# Altium schematic symbol library Minh_Lib.SchLib: 619 symbols (part 4 of 4) (continued)
## TAJD106K035RNJ (continued)
footprint Capacitor/Tantalum - SMD7343/D-AVX (D-7343/AVX)
pins: 1, 2
text: +

## TAJD106K050RNJ
designator C?  Supplier Part Number 1: 6993166
钽电容 10uF ±10% 50V 0.8Ω D型7343; Manufacturer: Kyocera AVX; Manufacturer Part Number: TAJD106K050RNJ; Dielectric Material: Tantalum; ESR (Equivalent Series Resistance): 800mR; Leakage Current: 5uA; Polarity: Polar; Dissipation Factor: 6%; Supplier 1: RSComponents; RoHS: Yes; Category: Tantalum Capacitors; Stock 1: 495; Pricing 1: 1=3.99400, 10=3.83300, 25=3.67200, 50=3.32200, 100=2.97200 (USD); Mount: Surface Mount,PCB; Case/Package: 2917; Number of Pins: 2; Case Code (Metric): 7343; Case Code (Imperial): 2917; Min Operating Temperature: -55°C; Max Operating Temperature: 125°C; Capacitance: 10uF; Tolerance: 10%; Voltage Rating (DC): 50V; Voltage Rating: 50V; Package Quantity: 1; Packaging: Tape and Reel; Termination: SMD/SMT; Voltage: 50V; Features: General Purpose; Series: TAJ; Construction: Flat; Length: 7.3mm; Width: 0.169inch; Height: 2.9mm; Depth: 4.3mm; Height - Seated (Max): 0.122inch; Radiation Hardening: No; Lead Free: Lead Free; RoHS Compliant: Yes; REACH SVHC: No SVHC; ComponentLink1URL: https://datasheet.ciiva.com/11793/0900766b80df8b87-11793657.pdf?src-supplier=RSComponents; ComponentLink1Description: https://datasheet.ciiva.com/11793/0900766b80df8b87-11793657.pdf?src-supplier=RSComponents; ComponentLink2URL: https://datasheet.ciiva.com/7730/49917-7730763.pdf?src-supplier=Element14; ComponentLink2Description: https://datasheet.ciiva.com/7730/49917-7730763.pdf?src-supplier=Element14; ComponentLink3URL: https://datasheet.ciiva.com/7730/49917-7730761.pdf?src-supplier=Element14; ComponentLink3Description: https://datasheet.ciiva.com/7730/49917-7730761.pdf?src-supplier=Element14; ComponentLink4URL: https://datasheet.ciiva.com/5937/taj-5937102.pdf?src-supplier=Farnell; ComponentLink4Description: https://datasheet.ciiva.com/5937/taj-5937102.pdf?src-supplier=Farnell; ComponentLink5URL: https://datasheet.ciiva.com/7730/taj-7730985.pdf?src-supplier=Element14; ComponentLink5Description: https://datasheet.ciiva.com/7730/taj-7730985.pdf?src-supplier=Element14; ComponentLink6URL: https://datasheet.ciiva.com/7730/1826076-7730762.pdf?src-supplier=Element14; ComponentLink6Description: https://datasheet.ciiva.com/7730/1826076-7730762.pdf?src-supplier=Element14; ComponentLink7URL: https://datasheet.ciiva.com/265/taj-265284.pdf?src-supplier=Digi-Key; ComponentLink7Description: https://datasheet.ciiva.com/265/taj-265284.pdf?src-supplier=Digi-Key; ComponentLink8URL: https://datasheet.ciiva.com/265/taj-265283.pdf?src-supplier=Digi-Key; ComponentLink8Description: https://datasheet.ciiva.com/265/taj-265283.pdf?src-supplier=Digi-Key; ComponentLink9URL: https://datasheet.ciiva.com/265/taj-265285.pdf?src-supplier=Digi-Key; ComponentLink9Description: https://datasheet.ciiva.com/265/taj-265285.pdf?src-supplier=Digi-Key; ComponentLink10URL: https://datasheet.ciiva.com/12911/taj-27497-12911222.pdf?src-supplier=Mouser; ComponentLink10Description: https://datasheet.ciiva.com/12911/taj-27497-12911222.pdf?src-supplier=Mouser; ComponentLink11URL: https://datasheet.ciiva.com/14585/70001050-14585949.pdf?src-supplier=Allied+Electronics; ComponentLink11Description: https://datasheet.ciiva.com/14585/70001050-14585949.pdf?src-supplier=Allied+Electronics; ComponentLink12URL: https://datasheet.ciiva.com/14598/70001050-14598925.pdf?src-supplier=Allied+Electronics; ComponentLink12Description: https://datasheet.ciiva.com/14598/70001050-14598925.pdf?src-supplier=Allied+Electronics; ComponentLink13URL: https://datasheet.ciiva.com/11227/taj-11227069.pdf?src-supplier=Avnet; ComponentLink13Description: https://datasheet.ciiva.com/11227/taj-11227069.pdf?src-supplier=Avnet
footprint Capacitor/Tantalum - SMD7343/D-AVX (D-7343/AVX)
pins: 1, 2
text: +

## TAJD107K006RNJ
designator C?  Supplier Part Number 1: 1360315
Cap Tant Solid 100uF 6.3V D CASE 10% (7.3 X 4.3 X 2.9mm) SMD 7343-31 0.9 Ohm 125AHA T/R; Manufacturer: Kyocera AVX; Manufacturer Part Number: TAJD107K006RNJ; ESR (Equivalent Series Resistance): 900mR; Polarity: Polar; Dissipation Factor: 6%; Supplier 1: RSComponents; RoHS: Yes; Category: Tantalum Capacitors; Stock 1: 110; Pricing 1: 500=0.71500, 2500=0.58900, 5000=0.53000 (USD); Mount: Surface Mount; Case/Package: 2917; Number of Pins: 2; Case Code (Metric): 7343; Case Code (Imperial): 2917; Min Operating Temperature: -55°C; Max Operating Temperature: 125°C; Capacitance: 100uF; Tolerance: 10%; Packaging: Tape and Reel; Voltage Rating: 6.3V; Package Quantity: 1; Termination: SMD/SMT; Voltage Rating (DC): 6.3V; Features: General Purpose; Series: TAJ; Construction: Flat; Length: 7.3mm; Width: 0.169inch; Height: 3.1mm; Depth: 4.3mm; Height - Seated (Max): 0.122inch; Radiation Hardening: No; REACH SVHC: No SVHC; Lead Free: Lead Free; RoHS Compliant: Yes; ComponentLink1URL: https://datasheet.ciiva.com/264/taj-264533.pdf?src-supplier=Digi-Key; ComponentLink1Description: https://datasheet.ciiva.com/264/taj-264533.pdf?src-supplier=Digi-Key; ComponentLink2URL: https://datasheet.ciiva.com/22703/1719052-22703317.pdf?src-supplier=Element14; ComponentLink2Description: https://datasheet.ciiva.com/22703/1719052-22703317.pdf?src-supplier=Element14; ComponentLink3URL: https://datasheet.ciiva.com/264/taj-264534.pdf?src-supplier=Digi-Key; ComponentLink3Description: https://datasheet.ciiva.com/264/taj-264534.pdf?src-supplier=Digi-Key; ComponentLink4URL: https://datasheet.ciiva.com/264/taj-264532.pdf?src-supplier=Digi-Key; ComponentLink4Description: https://datasheet.ciiva.com/264/taj-264532.pdf?src-supplier=Digi-Key; ComponentLink5URL: https://datasheet.ciiva.com/8080/1719052-8080374.pdf?src-supplier=Element14; ComponentLink5Description: https://datasheet.ciiva.com/8080/1719052-8080374.pdf?src-supplier=Element14; ComponentLink6URL: https://datasheet.ciiva.com/28609/taj-28609416.pdf?src-supplier=Element14; ComponentLink6Description: https://datasheet.ciiva.com/28609/taj-28609416.pdf?src-supplier=Element14; ComponentLink7URL: https://datasheet.ciiva.com/7720/1680476-7720620.pdf?src-supplier=Element14; ComponentLink7Description: https://datasheet.ciiva.com/7720/1680476-7720620.pdf?src-supplier=Element14; ComponentLink8URL: https://datasheet.ciiva.com/12910/taj-27497-12910172.pdf?src-supplier=Mouser; ComponentLink8Description: https://datasheet.ciiva.com/12910/taj-27497-12910172.pdf?src-supplier=Mouser; ComponentLink9URL: https://datasheet.ciiva.com/16492/taj-16492935.pdf?src-supplier=Future+Electronics; ComponentLink9Description: https://datasheet.ciiva.com/16492/taj-16492935.pdf?src-supplier=Future+Electronics
footprint Capacitor/Tantalum - SMD7343/D-AVX (D-7343/AVX)
pins: 1, 2
text: +

## TAJD107K010RNJ
designator C?  Supplier Part Number 1: 1360316
钽电容 100uF ±10% 10V 0.9Ω D型7343; Manufacturer: Kyocera AVX; Manufacturer Part Number: TAJD107K010RNJ; Dielectric Material: Tantalum; ESR (Equivalent Series Resistance): 700mR; Leakage Current: 10uA; Polarity: Polar; Dissipation Factor: 6%; Q Factor: 6; Supplier 1: RSComponents; RoHS: Yes; Category: Tantalum Capacitors; Stock 1: 1; Pricing 1: 500=0.39500, 1000=0.37900, 2500=0.35900 (USD); Mount: Surface Mount,PCB; Case/Package: 2917; Case Code (Imperial): 2917; Case Code (Metric): 7343; Min Operating Temperature: -55°C; Max Operating Temperature: 125°C; Capacitance: 100uF; Tolerance: 10%; Voltage Rating (DC): 10V; Voltage Rating: 10V; Packaging: Tape and Reel; Termination: SMD/SMT; Series: TAJ; Construction: Flat; Package Quantity: 1; Voltage: 10V; Features: General Purpose; Length: 7.3mm; Width: 4.3mm; Height: 2.9mm; Depth: 4.3mm; Height - Seated (Max): 0.122inch; Radiation Hardening: No; RoHS Compliant: Yes; Lead Free: Lead Free; REACH SVHC: No SVHC; ComponentLink1URL: https://datasheet.ciiva.com/11794/0900766b80ccdc61-11794409.pdf?src-supplier=RSComponents; ComponentLink1Description: https://datasheet.ciiva.com/11794/0900766b80ccdc61-11794409.pdf?src-supplier=RSComponents; ComponentLink2URL: https://datasheet.ciiva.com/7720/1680476-7720623.pdf?src-supplier=Element14; ComponentLink2Description: https://datasheet.ciiva.com/7720/1680476-7720623.pdf?src-supplier=Element14; ComponentLink3URL: https://datasheet.ciiva.com/264/taj-264490.pdf?src-supplier=Digi-Key; ComponentLink3Description: https://datasheet.ciiva.com/264/taj-264490.pdf?src-supplier=Digi-Key; ComponentLink4URL: https://datasheet.ciiva.com/264/taj-264489.pdf?src-supplier=Digi-Key; ComponentLink4Description: https://datasheet.ciiva.com/264/taj-264489.pdf?src-supplier=Digi-Key; ComponentLink5URL: https://datasheet.ciiva.com/264/taj-264491.pdf?src-supplier=Digi-Key; ComponentLink5Description: https://datasheet.ciiva.com/264/taj-264491.pdf?src-supplier=Digi-Key; ComponentLink6URL: https://datasheet.ciiva.com/7720/taj-7720621.pdf?src-supplier=Element14; ComponentLink6Description: https://datasheet.ciiva.com/7720/taj-7720621.pdf?src-supplier=Element14; ComponentLink7URL: https://datasheet.ciiva.com/7720/taj-7720622.pdf?src-supplier=Element14; ComponentLink7Description: https://datasheet.ciiva.com/7720/taj-7720622.pdf?src-supplier=Element14; ComponentLink8URL: https://datasheet.ciiva.com/14601/70001050-14601772.pdf?src-supplier=Allied+Electronics; ComponentLink8Description: https://datasheet.ciiva.com/14601/70001050-14601772.pdf?src-supplier=Allied+Electronics; ComponentLink9URL: https://datasheet.ciiva.com/3004/taj-3004510.pdf?src-supplier=Avnet; ComponentLink9Description: https://datasheet.ciiva.com/3004/taj-3004510.pdf?src-supplier=Avnet; ComponentLink10URL: https://datasheet.ciiva.com/16292/taj-16292489.pdf?src-supplier=Future+Electronics; ComponentLink10Description: https://datasheet.ciiva.com/16292/taj-16292489.pdf?src-supplier=Future+Electronics; ComponentLink11URL: https://datasheet.ciiva.com/15163/getdatasheetpartid-44469-15163019.pdf?src-supplier=Verical; ComponentLink11Description: https://datasheet.ciiva.com/15163/getdatasheetpartid-44469-15163019.pdf?src-supplier=Verical; ComponentLink12URL: https://datasheet.ciiva.com/16632/taj-16632699.pdf?src-supplier=Avnet+Europe; ComponentLink12Description: https://datasheet.ciiva.com/16632/taj-16632699.pdf?src-supplier=Avnet+Europe
footprint Capacitor/Tantalum - SMD7343/D-AVX (D-7343/AVX)
pins: 1, 2
text: +

## TAJD107K016RNJ
designator C?  Supplier Part Number 1: 1364592
钽电容 100uF ±10% 16V 0.6Ω D型7343; Manufacturer: Kyocera AVX; Manufacturer Part Number: TAJD107K016RNJ; Dielectric Material: Tantalum; ESR (Equivalent Series Resistance): 600mR; Leakage Current: 16uA; Dissipation Factor: 6%; Polarity: Polar; Supplier 1: RSComponents; RoHS: Yes; Category: Tantalum Capacitors; Stock 1: 1; Pricing 1: 10=0.93700, 50=0.79800, 200=0.70300, 500=0.61100 (USD); Mount: Surface Mount,PCB; Case/Package: 2917; Number of Pins: 2; Case Code (Imperial): 2917; Case Code (Metric): 7343; Min Operating Temperature: -55°C; Max Operating Temperature: 125°C; Capacitance: 100uF; Tolerance: 10%; Packaging: Tape and Reel; Voltage Rating: 16V; Voltage Rating (DC): 16V; Package Quantity: 1; Termination: SMD/SMT; Series: TAJ; Construction: Flat; Voltage: 16V; Features: General Purpose; Length: 7.3mm; Width: 4.3mm; Height: 2.9mm; Depth: 4.3mm; Height - Seated (Max): 0.122inch; Radiation Hardening: No; Lead Free: Lead Free; RoHS Compliant: Yes; REACH SVHC: No SVHC; ComponentLink1URL: https://datasheet.ciiva.com/11793/0900766b80ccdc61-11793278.pdf?src-supplier=RSComponents; ComponentLink1Description: https://datasheet.ciiva.com/11793/0900766b80ccdc61-11793278.pdf?src-supplier=RSComponents; ComponentLink2URL: https://datasheet.ciiva.com/26341/559463-da-01-en-tacc-d-7-3-mm-x-4-3-mm-x-2-9-mm-100-uf-26341798.pdf?src-supplier=Conrad; ComponentLink2Description: https://datasheet.ciiva.com/26341/559463-da-01-en-tacc-d-7-3-mm-x-4-3-mm-x-2-9-mm-100-uf-26341798.pdf?src-supplier=Conrad; ComponentLink3URL: https://datasheet.ciiva.com/18709/taj-eng-18709622.pdf?src-supplier=Distrelec; ComponentLink3Description: https://datasheet.ciiva.com/18709/taj-eng-18709622.pdf?src-supplier=Distrelec; ComponentLink4URL: https://datasheet.ciiva.com/6186/13070-6186749.pdf?src-supplier=Farnell; ComponentLink4Description: https://datasheet.ciiva.com/6186/13070-6186749.pdf?src-supplier=Farnell; ComponentLink5URL: https://datasheet.ciiva.com/264/taj-264341.pdf?src-supplier=Digi-Key; ComponentLink5Description: https://datasheet.ciiva.com/264/taj-264341.pdf?src-supplier=Digi-Key; ComponentLink6URL: https://datasheet.ciiva.com/264/taj-264340.pdf?src-supplier=Digi-Key; ComponentLink6Description: https://datasheet.ciiva.com/264/taj-264340.pdf?src-supplier=Digi-Key; ComponentLink7URL: https://datasheet.ciiva.com/264/taj-264342.pdf?src-supplier=Digi-Key; ComponentLink7Description: https://datasheet.ciiva.com/264/taj-264342.pdf?src-supplier=Digi-Key; ComponentLink8URL: https://datasheet.ciiva.com/14607/70001050-14607223.pdf?src-supplier=Allied+Electronics; ComponentLink8Description: https://datasheet.ciiva.com/14607/70001050-14607223.pdf?src-supplier=Allied+Electronics; ComponentLink9URL: https://datasheet.ciiva.com/3004/taj-3004512.pdf?src-supplier=Avnet; ComponentLink9Description: https://datasheet.ciiva.com/3004/taj-3004512.pdf?src-supplier=Avnet; ComponentLink10URL: https://datasheet.ciiva.com/16632/taj-16632700.pdf?src-supplier=Avnet+Europe; ComponentLink10Description: https://datasheet.ciiva.com/16632/taj-16632700.pdf?src-supplier=Avnet+Europe; ComponentLink11URL: https://datasheet.ciiva.com/16485/taj-16485829.pdf?src-supplier=Avnet+Asia; ComponentLink11Description: https://datasheet.ciiva.com/16485/taj-16485829.pdf?src-supplier=Avnet+Asia; ComponentLink12URL: https://datasheet.ciiva.com/3004/taj-3004511.pdf?src-supplier=Avnet; ComponentLink12Description: https://datasheet.ciiva.com/3004/taj-3004511.pdf?src-supplier=Avnet
footprint Capacitor/Tantalum - SMD7343/D-AVX (D-7343/AVX)
pins: 1, 2
text: +

## TAJD107K020RNJ
designator C?  Supplier Part Number 1: 5479603
钽电容 100uF ±10% 20V 0.5Ω D型7343; Manufacturer: Kyocera AVX; Manufacturer Part Number: TAJD107K020RNJ; Dielectric Material: Tantalum; Tolerance: 20%; ESR (Equivalent Series Resistance): 500mR; Leakage Current: 20uA; Polarity: Polar; Dissipation Factor: 6%; Supplier 1: RSComponents; RoHS: Yes; Category: Tantalum Capacitors; Stock 1: 1; Pricing 1: 25=1.23100, 100=1.18100, 250=1.13200 (USD); Mount: Surface Mount,PCB; Case/Package: 2917; Case Code (Imperial): 2917; Case Code (Metric): 7343; Min Operating Temperature: -55°C; Max Operating Temperature: 125°C; Capacitance: 100uF; Packaging: Tape and Reel; Voltage Rating: 20V; Voltage Rating (DC): 20V; Package Quantity: 1; Termination: SMD/SMT; Voltage: 20V; Features: General Purpose; Series: TAJ; Construction: Flat; Length: 7.3mm; Width: 4.3mm; Height: 2.9mm; Depth: 4.3mm; Height - Seated (Max): 0.122inch; Radiation Hardening: No; REACH SVHC: No SVHC; Lead Free: Lead Free; RoHS Compliant: Yes; ComponentLink1URL: https://datasheet.ciiva.com/11794/0900766b802e69d0-11794406.pdf?src-supplier=RSComponents; ComponentLink1Description: https://datasheet.ciiva.com/11794/0900766b802e69d0-11794406.pdf?src-supplier=RSComponents; ComponentLink2URL: https://datasheet.ciiva.com/26944/getdatasheetpartid-149144-26944852.pdf?src-supplier=Verical; ComponentLink2Description: https://datasheet.ciiva.com/26944/getdatasheetpartid-149144-26944852.pdf?src-supplier=Verical; ComponentLink3URL: https://datasheet.ciiva.com/18709/taj-eng-18709621.pdf?src-supplier=Distrelec; ComponentLink3Description: https://datasheet.ciiva.com/18709/taj-eng-18709621.pdf?src-supplier=Distrelec; ComponentLink4URL: https://datasheet.ciiva.com/7720/1680476-7720629.pdf?src-supplier=Element14; ComponentLink4Description: https://datasheet.ciiva.com/7720/1680476-7720629.pdf?src-supplier=Element14; ComponentLink5URL: https://datasheet.ciiva.com/7720/1680476-7720630.pdf?src-supplier=Element14; ComponentLink5Description: https://datasheet.ciiva.com/7720/1680476-7720630.pdf?src-supplier=Element14; ComponentLink6URL: https://datasheet.ciiva.com/264/taj-264937.pdf?src-supplier=Digi-Key; ComponentLink6Description: https://datasheet.ciiva.com/264/taj-264937.pdf?src-supplier=Digi-Key; ComponentLink7URL: https://datasheet.ciiva.com/264/taj-264936.pdf?src-supplier=Digi-Key; ComponentLink7Description: https://datasheet.ciiva.com/264/taj-264936.pdf?src-supplier=Digi-Key; ComponentLink8URL: https://datasheet.ciiva.com/264/taj-264938.pdf?src-supplier=Digi-Key; ComponentLink8Description: https://datasheet.ciiva.com/264/taj-264938.pdf?src-supplier=Digi-Key; ComponentLink9URL: https://datasheet.ciiva.com/12882/taj-27497-12882854.pdf?src-supplier=Mouser; ComponentLink9Description: https://datasheet.ciiva.com/12882/taj-27497-12882854.pdf?src-supplier=Mouser; ComponentLink10URL: https://datasheet.ciiva.com/14605/70001050-14605109.pdf?src-supplier=Allied+Electronics; ComponentLink10Description: https://datasheet.ciiva.com/14605/70001050-14605109.pdf?src-supplier=Allied+Electronics; ComponentLink11URL: https://datasheet.ciiva.com/14606/70001050-14606299.pdf?src-supplier=Allied+Electronics; ComponentLink11Description: https://datasheet.ciiva.com/14606/70001050-14606299.pdf?src-supplier=Allied+Electronics; ComponentLink12URL: https://datasheet.ciiva.com/3004/taj-3004513.pdf?src-supplier=Avnet; ComponentLink12Description: https://datasheet.ciiva.com/3004/taj-3004513.pdf?src-supplier=Avnet; ComponentLink13URL: https://datasheet.ciiva.com/16217/taj-16217750.pdf?src-supplier=Future+Electronics; ComponentLink13Description: https://datasheet.ciiva.com/16217/taj-16217750.pdf?src-supplier=Future+Electronics; ComponentLink14URL: https://datasheet.ciiva.com/16632/taj-16632701.pdf?src-supplier=Avnet+Europe; ComponentLink14Description: https://datasheet.ciiva.com/16632/taj-16632701.pdf?src-supplier=Avnet+Europe; ComponentLink15URL: https://datasheet.ciiva.com/3004/taj-3004514.pdf?src-supplier=Avnet; ComponentLink15Description: https://datasheet.ciiva.com/3004/taj-3004514.pdf?src-supplier=Avnet
footprint Capacitor/Tantalum - SMD7343/D-AVX (D-7343/AVX)
pins: 1, 2
text: +

## TAJD108K002RNJ
designator C?  Supplier Part Number 1: TAJD108K002RNJ-ND
Cap Tant 1000UF 10% 2.5V 2917; Manufacturer: Kyocera AVX; Manufacturer Part Number: TAJD108K002RNJ; Capacitance: 1mF; ESR (Equivalent Series Resistance): 200mR; Supplier 1: Digi-Key; RoHS: Yes; Category: Tantalum Capacitors; Mount: Surface Mount; Case/Package: 2917; Min Operating Temperature: -55°C; Max Operating Temperature: 125°C; Package Quantity: 500; Voltage Rating: 2.5V; Tolerance: 10%; Packaging: Tape and Reel; Voltage Rating (DC): 2.5V; Features: General Purpose; Series: TAJ; Length: 0.287inch; Width: 0.169inch; Height - Seated (Max): 0.122inch; Lead Free: Lead Free; RoHS Compliant: Yes; ComponentLink1URL: https://datasheet.ciiva.com/285/taj-285216.pdf?src-supplier=Digi-Key; ComponentLink1Description: https://datasheet.ciiva.com/285/taj-285216.pdf?src-supplier=Digi-Key
footprint Capacitor/Tantalum - SMD7343/D-AVX (D-7343/AVX)
pins: 1, 2
text: +

## TAJD108K004RNJ
designator C?  Supplier Part Number 1: 1355375
钽电容 1000uF ±10% 4V 0.2Ω D型7343; Manufacturer: Kyocera AVX; Manufacturer Part Number: TAJD108K004RNJ; Dielectric Material: Tantalum; Capacitance: 1mF; ESR (Equivalent Series Resistance): 200mR; Leakage Current: 40uA; Polarity: Polar; Dissipation Factor: 60%; Supplier 1: RSComponents; RoHS: Yes; Category: Tantalum Capacitors; Stock 1: 1; Pricing 1: 2=4.17600, 20=3.96700, 40=3.77200, 100=1.46600, 200=1.38500 (USD); Mount: Surface Mount; Case/Package: 2917; Case Code (Metric): 7343; Case Code (Imperial): 2917; Min Operating Temperature: -55°C; Max Operating Temperature: 125°C; Tolerance: 10%; Package Quantity: 500; Voltage Rating: 4V; Packaging: Tape and Reel; Termination: SMD/SMT; Features: General Purpose; Series: TAJ; Construction: Flat; Length: 7.3mm; Width: 0.169inch; Height: 3.1mm; Depth: 4.3mm; Height - Seated (Max): 0.122inch; Radiation Hardening: No; REACH SVHC: No SVHC; Lead Free: Lead Free; RoHS Compliant: Yes; ComponentLink1URL: https://datasheet.ciiva.com/7853/49917-7853141.pdf?src-supplier=Element14; ComponentLink1Description: https://datasheet.ciiva.com/7853/49917-7853141.pdf?src-supplier=Element14; ComponentLink2URL: https://datasheet.ciiva.com/7853/49917-7853142.pdf?src-supplier=Element14; ComponentLink2Description: https://datasheet.ciiva.com/7853/49917-7853142.pdf?src-supplier=Element14; ComponentLink3URL: https://datasheet.ciiva.com/284/taj-284848.pdf?src-supplier=Digi-Key; ComponentLink3Description: https://datasheet.ciiva.com/284/taj-284848.pdf?src-supplier=Digi-Key
footprint Capacitor/Tantalum - SMD7343/D-AVX (D-7343/AVX)
pins: 1, 2
text: +

## XC6204B332MR
designator CMOS?  Supplier Part Number 1: 3605840  Supplier Part Number 2: 1028-1014-1-ND
IC REG LDO 3.3V 0.3A SOT23-5; Manufacturer: Torex; Manufacturer Part Number: XC6204B332MR; Polarity: Positive; Nominal Supply Current: 70uA; Dropout Voltage: 220mV; Min Input Voltage: 2.5V; Max Input Voltage: 5.5V; Output Current: 300mA; Number of Regulators: 1; Min Current Limit: 360mA; Output Type: Fixed; Quiescent Current: 130uA; Power Supply Rejection Ratio (PSRR): 50dB; Supplier 1: Farnell; RoHS: Yes; Category: Voltage Regulators - Linear; Pricing 1: 1=0.34700, 10=0.26700, 100=0.22300, 500=0.20200 (GBP); Case/Package: SOT-23-5; Output Voltage: 3.3V; Supply Current: 70uA; RoHS Compliant: Yes; ComponentLink1URL: https://www.distrelec.biz/Web/Downloads/he/et/XC6204_eng_datasheet.pdf?mime=application%2Fpdf&src-supplier=Distrelec; ComponentLink1Description: https://www.distrelec.biz/Web/Downloads/he/et/XC6204_eng_datasheet.pdf?mime=application%2Fpdf&src-supplier=Distrelec; Supplier 2: Digi-Key; Stock 2: 23759; Pricing 2: 1=0.56000, 10=0.47700, 25=0.44520, 100=0.35620, 250=0.33072, 500=0.27984, 1000=0.21624 (USD); Mount: Surface Mount; Number of Pins: 5; Min Operating Temperature: -40°C; Max Operating Temperature: 125°C; Packaging: Cut Tape; Nominal Output Voltage: 3.3V; Series: -; Output Configuration: Positive; Min Output Voltage: 3.3V; Lead Free: Lead Free; ComponentLink2URL: https://datasheet.ciiva.com/2046/3d3futf-83fb3frfm5mtkzlte2lnbkzg3d3d3f3d-2046896.pdf?src-supplier=Digi-Key; ComponentLink2Description: https://datasheet.ciiva.com/2046/3d3futf-83fb3frfm5mtkzlte2lnbkzg3d3d3f3d-2046896.pdf?src-supplier=Digi-Key; ComponentLink3URL: https://datasheet.ciiva.com/28652/1782157-28652989.pdf?src-supplier=Element14; ComponentLink3Description: https://datasheet.ciiva.com/28652/1782157-28652989.pdf?src-supplier=Element14
footprint SOT25
pins: 1 VIN (power), 2 VSS, 3 CE, 4 NC , 5 VOUT (power)